# Altium schematic symbol library BARKO_SCHLIB.SchLib: 1064 symbols (part 9 of 11) (continued)
## R-2R49-2512 (continued)

## R-3K3-0402
designator R?, comment 3K3  Tolerance: 1%  Case Code (Imperial): 0402
RES SMD 3.3K OHM 1% 1/10W 0402; Manufacturer: Panasonic; Manufacturer Part Number: ERJ-2RKF3301X; Resistance: 3.3kR; Temperature Coefficient: 100ppm/°C; Power Rating: 100mW; Voltage Rating: 50V; .PCBCHK: USED; .Creator: F:TALI; Washability: OK; Stock 1: 1719958; Pricing 1: 1=0.1, 10=0.045, 100=0.0183, 1000=0.00823, 2500=0.00715, 5000=0.0059 (USD); Mount: Surface Mount; Case/Package: 0402; Number of Pins: 2; Contact Plating: Tin; Case Code (Metric): 1005; Min Operating Temperature: -55°C; Max Operating Temperature: 155°C; Composition: Thick Film; Packaging: Tape and Reel; Package Quantity: 1; Number of Terminations: 2; Termination: SMD/SMT; Military Standard: Not; Max Power Dissipation: 100mW; Voltage Rating (DC): 50V; Features: Automotive AEC-Q200; Length: 1mm; Height: 0.35mm; Width: 0.02inch; Depth: 0.5mm; Radiation Hardening: No; REACH SVHC: No SVHC; Lead Free: Lead Free; ComponentLink1URL: http://www.farnell.com/datasheets/1678782.pdf; ComponentLink1Description: http://www.farnell.com/datasheets/1678782.pdf; ComponentLink2URL: http://industrial.panasonic.com/www-data/pdf/AOA0000/AOA0000CE2.pdf; ComponentLink2Description: http://industrial.panasonic.com/www-data/pdf/AOA0000/AOA0000CE2.pdf; ComponentLink3URL: http://www.alliedelec.com/m/d/623f45ff1957d936ff56d46fd1c28cac.pdf; ComponentLink3Description: http://www.alliedelec.com/m/d/623f45ff1957d936ff56d46fd1c28cac.pdf; ComponentLink4URL: http://www.farnell.com/datasheets/1911175.pdf; ComponentLink4Description: http://www.farnell.com/datasheets/1911175.pdf; Stock 2: 19896; Pricing 2: 1=0.1, 10=0.076, 100=0.029, 1000=0.01278, 2500=0.01104, 5000=0.00987 (USD); Thickness: 356um; ComponentLink5URL: http://www.bourns.com/pdfs/CR0402.pdf; ComponentLink5Description: http://www.bourns.com/pdfs/CR0402.pdf; ComponentLink6URL: https://www.verical.com/server-webapp/html/getDatasheet?partID=33138; ComponentLink6Description: https://www.verical.com/server-webapp/html/getDatasheet?partID=33138; Stock 3: 49804; Pricing 3: 1=0.1, 10=0.016, 100=0.0064, 1000=0.00289, 2500=0.0025, 5000=0.00207 (USD); .SCHCHK: USED; Supplier 1: Digi-Key; Supplier Part Number 1: RMCF0402FT3K30DKR-ND
footprint R-0402
pins: 1, 2

## R-3K3-0603
designator R?, comment 3K3  Tolerance: 1%  Case Code (Imperial): 0603
RES SMD 3.3K OHM 1% 1/10W 0603; Manufacturer: Yageo; Manufacturer Part Number: RC0603JR-073K3L; Resistance: 3.3kR; Power Rating: 100mW; Voltage Rating: 50V; Temperature Coefficient: 100ppm/°C; .PCBCHK: USED; .Creator: F:TALI; Washability: OK; Case/Package: 0603; Number of Pins: 2; Case Code (Metric): 1608; Min Operating Temperature: -55°C; Max Operating Temperature: 155°C; Voltage Rating (DC): 50V; Packaging: Tape and Reel; Termination: SMD/SMT; Composition: Thick Film; Military Standard: Not; Length: 1.6mm; Width: 0.8mm; Depth: 0.8mm; REACH SVHC: No SVHC; Lead Free: Lead Free; ComponentLink1URL: http://www.farnell.com/datasheets/443971.pdf; ComponentLink1Description: http://www.farnell.com/datasheets/443971.pdf; Stock 1: 1678788; Pricing 1: 1=0.1, 10=0.065, 100=0.0264, 1000=0.01186, 2500=0.01029 (USD); Mount: Surface Mount; Contact Plating: Tin; Package Quantity: 1; Number of Terminations: 2; Max Power Dissipation: 100mW; Features: Automotive AEC-Q200; Height: 0.022inch; Radiation Hardening: No; ComponentLink2URL: http://www.alliedelec.com/m/d/623f45ff1957d936ff56d46fd1c28cac.pdf; ComponentLink2Description: http://www.alliedelec.com/m/d/623f45ff1957d936ff56d46fd1c28cac.pdf; ComponentLink3URL: http://www.farnell.com/datasheets/1678782.pdf; ComponentLink3Description: http://www.farnell.com/datasheets/1678782.pdf; ComponentLink4URL: http://industrial.panasonic.com/www-data/pdf/AOA0000/AOA0000CE2.pdf; ComponentLink4Description: http://industrial.panasonic.com/www-data/pdf/AOA0000/AOA0000CE2.pdf; ComponentLink5URL: http://www.farnell.com/datasheets/426256.pdf; ComponentLink5Description: http://www.farnell.com/datasheets/426256.pdf; .SCHCHK: USED; Stock 2: 97674; Pricing 2: 1=0.10000, 10=0.01700, 100=0.00680, 1000=0.00306, 2500=0.00266 (USD); RoHS: Yes; ComponentLink6URL: https://datasheet.ciiva.com/15193/getdatasheetpartid-376121-15193477.pdf?src-supplier=Verical; ComponentLink6Description: https://datasheet.ciiva.com/15193/getdatasheetpartid-376121-15193477.pdf?src-supplier=Verical; Stock 3: 171378; Pricing 3: 1=0.10000, 10=0.02300, 100=0.00950, 1000=0.00429, 2500=0.00372 (USD); ComponentLink7URL: https://datasheet.ciiva.com/5554/rk73h-5554599.pdf?src-supplier=Mouser; ComponentLink7Description: https://datasheet.ciiva.com/5554/rk73h-5554599.pdf?src-supplier=Mouser; ComponentLink8URL: https://datasheet.ciiva.com/48426/rk73h-series-eng-jap-tds-48426588.pdf?src-supplier=Distrelec; ComponentLink8Description: https://datasheet.ciiva.com/48426/rk73h-series-eng-jap-tds-48426588.pdf?src-supplier=Distrelec; Supplier 1: Digi-Key; Supplier Part Number 1: RMCF0603FT3K30CT-ND
footprint R-0603
pins: 1, 2

## R-3K3-0804
designator R?, comment 3K3
RES ARRAY 4 RES 3.3K OHM 0804; Manufacturer: Panasonic; Manufacturer Part Number: EXB-28V332JX; Number of Terminals/Pins: 8; Resistance: 3.3kR; Tolerance: 5%; Voltage Rating: 50V; Number of Elements: 4; Voltage Rating (DC): 100V; Circuit Type: Isolated; Power Per Element: 62.5mW; Temperature Coefficient: 200ppm/°C; Supplier 1: Digi-Key; RoHS: Yes; Category: Resistor Arrays; Stock 1: 11021; Pricing 1: 1=0.10000, 10=0.07200, 25=0.04960, 50=0.03860, 100=0.02750, 250=0.02144, 500=0.01706, 1000=0.01210, 5000=0.00935 (USD); Mount: Surface Mount; Case/Package: 0804; Number of Pins: 8; Contact Plating: Tin; Case Code (Metric): 1005; Case Code (Imperial): 0402; Min Operating Temperature: -55°C; Max Operating Temperature: 125°C; Packaging: Tape and Reel; Package Quantity: 1; Number of Contacts: 8; Number of Resistors: 4; Termination: Convex; Length: 2mm; Width: 0.039inch; Height: 0.018inch; Terminal Pitch: 0.5mm; Radiation Hardening: No; REACH SVHC: No SVHC; ComponentLink1URL: https://datasheet.ciiva.com/5735/1480003-5735116.pdf?src-supplier=Farnell; ComponentLink1Description: https://datasheet.ciiva.com/5735/1480003-5735116.pdf?src-supplier=Farnell; ComponentLink2URL: https://datasheet.ciiva.com/30180/aoc0000ce1-30180253.pdf?src-supplier=Onlinecomponents.com; ComponentLink2Description: https://datasheet.ciiva.com/30180/aoc0000ce1-30180253.pdf?src-supplier=Onlinecomponents.com; ComponentLink3URL: https://datasheet.ciiva.com/46400/1480003-46400588.pdf?src-supplier=Element14; ComponentLink3Description: https://datasheet.ciiva.com/46400/1480003-46400588.pdf?src-supplier=Element14; Supplier Part Number 1: Y7332CT-ND
footprint R-0804 (SMD, 8-Leads, Body 2x1mm, Pitch 0.5mm)
pins: 1, 2, 3, 4, 5, 6, 7, 8

## R-3K3-0805
designator R?, comment 3K3  Case Code (Imperial): 0805
RES SMD 3.3K OHM 1/8W 5% 0805; Manufacturer: Stackpole Electronics; Manufacturer Part Number: RMCF0805JT3K30; Resistance: 3.3kR; Power Rating: 125mW; Temperature Coefficient: 200ppm/°C; Voltage Rating (DC): 150V; .PCBCHK: USED; .Creator: F:TALI; Washability: OK; Stock 1: 73817; Pricing 1: 1=0.1, 10=0.021, 100=0.0086, 1000=0.00385, 2500=0.00334 (USD); Mount: Surface Mount; Case/Package: 0805; Case Code (Metric): 2012; Contact Plating: Matte,Tin; Min Operating Temperature: -55°C; Max Operating Temperature: 155°C; Packaging: Tape and Reel; Tolerance: 5%; Composition: Thick Film; Number of Terminations: 2; Military Standard: Not; Max Power Dissipation: 125mW; Features: Automotive AEC-Q200; Length: 2mm; Height: 0.026inch; Width: 0.049inch; Depth: 1.25mm; Radiation Hardening: No; Lead Free: Lead Free; ComponentLink1URL: https://www.verical.com/server-webapp/html/getDatasheet?partID=360140; ComponentLink1Description: https://www.verical.com/server-webapp/html/getDatasheet?partID=360140; Stock 2: 12604; Pricing 2: 1=0.1, 10=0.059, 100=0.024, 1000=0.01079, 2500=0.00936 (USD); ComponentLink2URL: http://www.samsungsem.com/kr/support/library/product-catalog/__icsFiles/afieldfile/2015/09/22/CHIP_RESISTOR_2015.pdf; ComponentLink2Description: http://www.samsungsem.com/kr/support/library/product-catalog/__icsFiles/afieldfile/2015/09/22/CHIP_RESISTOR_2015.pdf; Stock 3: 6239; Pricing 3: 1=0.1, 10=0.049, 100=0.02, 1000=0.00898, 2500=0.00779 (USD); Package Quantity: 5000; ComponentLink3URL: http://www.te.com/commerce/DocumentDelivery/DDEController?Action=srchrtrv&DocNm=1773204&DocType=DS&DocLang=English; ComponentLink3Description: http://www.te.com/commerce/DocumentDelivery/DDEController?Action=srchrtrv&DocNm=1773204&DocType=DS&DocLang=English; ComponentLink4URL: http://www.onlinecomponents.com/productFiles/mf-AMP/eng_ds_1773204_e.pdf; ComponentLink4Description: http://www.onlinecomponents.com/productFiles/mf-AMP/eng_ds_1773204_e.pdf; ComponentLink5URL: http://www.te.com/commerce/DocumentDelivery/DDEController?Action=showdoc&DocId=Data+Sheet%7F1773204%7FF%7Fpdf%7FEnglish%7FENG_DS_1773204_F.pdf; ComponentLink5Description: http://www.te.com/commerce/DocumentDelivery/DDEController?Action=showdoc&DocId=Data+Sheet%7F1773204%7FF%7Fpdf%7FEnglish%7FENG_DS_1773204_F.pdf; .SCHCHK: USED; Supplier 1: Digi-Key; Supplier Part Number 1: RMCF0805JT3K30DKR-ND
footprint R-0805
pins: 1, 2

## R-3K3-1206 Array
designator R?, comment 3K3
RES ARRAY 4 RES 3.3K OHM 1206; Manufacturer: Stackpole Electronics; Manufacturer Part Number: RAVF164DJT3K30; Number of Terminals/Pins: 8; Temperature Coefficient: 200ppm/°C; Resistance: 3.3kR; Tolerance: 5%; Circuit Type: Isolated; Number of Resistors: 4; Power Per Element: 62.5mW; Supplier 1: Digi-Key; RoHS: Yes; Category: Resistor Arrays; Stock 1: 569; Pricing 1: 1=0.10000, 10=0.04400, 25=0.03160, 50=0.02400, 100=0.01770, 250=0.01352, 500=0.01080, 1000=0.00795 (USD); Mount: Surface Mount; Case/Package: SMD/SMT; Number of Pins: 8; Case Code (Metric): 3216; Case Code (Imperial): 1206; Min Operating Temperature: -55°C; Max Operating Temperature: 155°C; Package Quantity: 1; Packaging: Tape and Reel; Termination: Convex; Length: 0.126inch; Width: 0.063inch; Height: 0.024inch; Depth: 1.6mm; Terminal Pitch: 0.8mm; Radiation Hardening: No; Military Standard: Not; ComponentLink1URL: https://www.verical.com/server-webapp/html/getDatasheet?partID=365383&src-supplier=Verical; ComponentLink1Description: https://www.verical.com/server-webapp/html/getDatasheet?partID=365383&src-supplier=Verical; ComponentLink2URL: https://www.seielect.com/catalog/SEI-Packaging.pdf?src-supplier=Digi-Key; ComponentLink2Description: https://www.seielect.com/catalog/SEI-Packaging.pdf?src-supplier=Digi-Key; ComponentLink3URL: https://www.seielect.com/Catalog/SEI-RAVF.pdf?src-supplier=Digi-Key; ComponentLink3Description: https://www.seielect.com/Catalog/SEI-RAVF.pdf?src-supplier=Digi-Key; ComponentLink4URL: https://www.seielect.com/Catalog/SEI-RAVF.pdf?src-supplier=Avnet; ComponentLink4Description: https://www.seielect.com/Catalog/SEI-RAVF.pdf?src-supplier=Avnet; Supplier Part Number 1: RAVF164DJT3K30CT-ND
footprint R-1206-ARRAY (SMD, 8-Leads, Body 1.6x3.2mm, Pitch 0.8mm)
pins: 1, 2, 3, 4, 5, 6, 7, 8

## R-3K6-0603
designator R?, comment 3K6  Case Code (Imperial): 0603
RES SMD 3.6K OHM 5% 1/10W 0603; Manufacturer: Yageo; Manufacturer Part Number: RC0603JR-073K6L; Resistance: 3.6kR; Temperature Coefficient: 100ppm/°C; Power Rating: 100mW; Voltage Rating: 75V; Voltage Rating (DC): 50V; .PCBCHK: USED; .Creator: F:TALI; Washability: OK; Stock 1: 445800; Pricing 1: 1=0.1, 10=0.022, 100=0.0088, 1000=0.00396, 2500=0.00344 (USD); Case/Package: 0603; Weight: 7.1E-05oz; Contact Plating: Matte,Tin; Case Code (Metric): 1608; Min Operating Temperature: -55°C; Max Operating Temperature: 155°C; Tolerance: 5%; Composition: Thick Film; Packaging: Tape and Reel; Termination: SMD/SMT; Military Standard: Not; Length: 1.6mm; Height: 0.45mm; Width: 0.8mm; Depth: 0.8mm; Lead Free: Lead Free; ComponentLink1URL: http://www.yageo.com/documents/recent/PYu-RC0603_51_RoHS_L_4.pdf; ComponentLink1Description: http://www.yageo.com/documents/recent/PYu-RC0603_51_RoHS_L_4.pdf; Mount: Surface Mount; Number of Terminations: 2; Max Power Dissipation: 100mW; Features: Automotive AEC-Q200; Package Quantity: 1; Working Voltage: 75V; Radiation Hardening: No; REACH SVHC: Unknown; ComponentLink2URL: http://uk.rs-online.com/webdocs/0d98/0900766b80d98afc.pdf; ComponentLink2Description: http://uk.rs-online.com/webdocs/0d98/0900766b80d98afc.pdf; ComponentLink3URL: http://www.vishay.com/docs/20035/dcrcwe3.pdf; ComponentLink3Description: http://www.vishay.com/docs/20035/dcrcwe3.pdf; ComponentLink4URL: https://www.alliedelec.com/m/d/0c934d6939ccefa68dbe0b96d821c8cf.pdf; ComponentLink4Description: https://www.alliedelec.com/m/d/0c934d6939ccefa68dbe0b96d821c8cf.pdf; ComponentLink5URL: http://www.mouser.com/ds/2/427/dcrcwe3-109170.pdf; ComponentLink5Description: http://www.mouser.com/ds/2/427/dcrcwe3-109170.pdf; Stock 2: 480818; Pricing 2: 1=0.1, 10=0.043, 100=0.0176, 1000=0.00791, 2500=0.00686 (USD); ComponentLink6URL: http://www.farnell.com/datasheets/2059623.pdf; ComponentLink6Description: http://www.farnell.com/datasheets/2059623.pdf; ComponentLink7URL: http://industrial.panasonic.com/www-data/pdf/AOA0000/AOA0000CE1.pdf; ComponentLink7Description: http://industrial.panasonic.com/www-data/pdf/AOA0000/AOA0000CE1.pdf; ComponentLink8URL: https://www.alliedelec.com/m/d/51cd0790071e1666bdb9d00c57fcf960.pdf; ComponentLink8Description: https://www.alliedelec.com/m/d/51cd0790071e1666bdb9d00c57fcf960.pdf; Stock 3: 334768; Pricing 3: 1=0.1, 10=0.065, 100=0.0264, 1000=0.01186, 2500=0.01029 (USD); ComponentLink9URL: http://industrial.panasonic.com/cdbs/www-data/pdf/RDA0000/AOA0000COL19.pdf; ComponentLink9Description: http://industrial.panasonic.com/cdbs/www-data/pdf/RDA0000/AOA0000COL19.pdf; ComponentLink10URL: https://www.alliedelec.com/m/d/623f45ff1957d936ff56d46fd1c28cac.pdf; ComponentLink10Description: https://www.alliedelec.com/m/d/623f45ff1957d936ff56d46fd1c28cac.pdf; ComponentLink11URL: http://industrial.panasonic.com/www-data/pdf/AOA0000/AOA0000CE2.pdf; ComponentLink11Description: http://industrial.panasonic.com/www-data/pdf/AOA0000/AOA0000CE2.pdf; ComponentLink12URL: http://www.farnell.com/datasheets/1678782.pdf; ComponentLink12Description: http://www.farnell.com/datasheets/1678782.pdf; ComponentLink13URL: http://www.alliedelec.com/m/d/623f45ff1957d936ff56d46fd1c28cac.pdf; ComponentLink13Description: http://www.alliedelec.com/m/d/623f45ff1957d936ff56d46fd1c28cac.pdf; ComponentLink14URL: http://components.arrow.com/part/dataview/3984664S9736721N1386; ComponentLink14Description: http://components.arrow.com/part/dataview/3984664S9736721N1386; .SCHCHK: USED; Supplier 1: Digi-Key; Supplier Part Number 1: 311-3.6KGRDKR-ND
footprint R-0603
pins: 1, 2

## R-3K6-0805
designator R?, comment 3K6  Case Code (Imperial): 0805
RES SMD 3.6K OHM 5% 1/8W 0805; Manufacturer: Yageo; Manufacturer Part Number: RC0805JR-073K6L; Resistance: 3.6kR; Temperature Coefficient: 100ppm/°C; Power Rating: 125mW; Voltage Rating: 150V; .PCBCHK: USED; .Creator: F:TALI; Washability: OK; Stock 1: 31900; Pricing 1: 100=0.03482, 1000=0.01429, 5000=0.00635, 15000=0.00531, 50000=0.00449 (USD); Case/Package: 0805; Contact Plating: Matte,Tin; Case Code (Metric): 2012; Min Operating Temperature: -55°C; Max Operating Temperature: 155°C; Tolerance: 5%; Composition: Thick Film; Packaging: Tape and Reel; Termination: SMD/SMT; Military Standard: Not; Voltage Rating (DC): 150V; Length: 2mm; Height: 0.5mm; Width: 1.25mm; Depth: 1.25mm; Radiation Hardening: No; Lead Free: Lead Free; ComponentLink1URL: http://www.mouser.com/ds/2/447/Yageo_08112016_RC0805-968729.pdf; ComponentLink1Description: http://www.mouser.com/ds/2/447/Yageo_08112016_RC0805-968729.pdf; ComponentLink2URL: http://www.yageo.ru/pdf/RC0805.pdf; ComponentLink2Description: http://www.yageo.ru/pdf/RC0805.pdf; Stock 2: 7308; Pricing 2: 1=0.1, 10=0.028, 100=0.0114, 1000=0.00513, 2500=0.00445 (USD); Mount: Surface Mount; Number of Terminations: 2; Max Power Dissipation: 125mW; Features: Automotive AEC-Q200; Stock 3: 68500; Pricing 3: 1=0.1, 10=0.081, 100=0.0311, 1000=0.01367, 2500=0.01181 (USD); Weight: 0.000194oz; Package Quantity: 1; REACH SVHC: No SVHC; ComponentLink3URL: http://www.farnell.com/datasheets/1678782.pdf; ComponentLink3Description: http://www.farnell.com/datasheets/1678782.pdf; ComponentLink4URL: http://www.mouser.com/ds/2/315/AOA0000C283-1093288.pdf; ComponentLink4Description: http://www.mouser.com/ds/2/315/AOA0000C283-1093288.pdf; .SCHCHK: USED; Supplier 1: TME; Supplier Part Number 1: RC0805JR-073K6
footprint R-0805
pins: 1, 2

## R-3mR-1206
designator R?, comment Resistance: 3mR  Power Rating: 1W  Case Code (Imperial): 1206  (hidden comment: CSNL1206FT3L00)
RES 0.003 OHM 1% 1W 1206; Manufacturer: Stackpole Electronics; Temperature Coefficient: 50ppm/°C; Washability: OK; .Creator: M.OZKAN; .PCBCHK: USED; Supplier 1: Arrow; Manufacturer Part Number: CSNL1206FT3L00; Stock 1: 4000; Pricing 1: 1=0,59390, 10=0,50440, 25=0,43770, 100=0,34920, 250=0,31240, 500=0,25490, 1000=0,20690, 3000=0,20490 (USD); RoHS: Yes; Mount: Surface Mount; Case/Package: 1206; Case Code (Metric): 3216; Contact Plating: Tin,Matte; Min Operating Temperature: -55°C; Max Operating Temperature: 170°C; Tolerance: 1%; Packaging: Tape and Reel; Composition: Metal Foil; Number of Terminations: 2; Military Standard: Not; Max Power Dissipation: 1W; Features: Moisture Resistant; Length: 0.126inch; Height: 0.035inch; Width: 0.063inch; Depth: 1.6mm; Radiation Hardening: No; Lead Free: Lead Free; ComponentLink1URL: http://components.arrow.com/part/dataview/55793397S789987N1174?src-supplier=Arrow; ComponentLink1Description: http://components.arrow.com/part/dataview/55793397S789987N1174?src-supplier=Arrow; ComponentLink2URL: https://www.seielect.com/catalog/SEI-Packaging.pdf?src-supplier=Digi-Key; ComponentLink2Description: https://www.seielect.com/catalog/SEI-Packaging.pdf?src-supplier=Digi-Key; ComponentLink3URL: https://www.seielect.com/Catalog/SEI-CSNL.pdf?src-supplier=Avnet; ComponentLink3Description: https://www.seielect.com/Catalog/SEI-CSNL.pdf?src-supplier=Avnet; Supplier Part Number 1: CSNL1206FT3L00; .SCHCHK: USED
footprint R-1206
pins: 1, 2

## R-3R3-0603
designator R?, comment 3R3
RES 3.3 OHM 5% 1/10W 0603; Manufacturer: Stackpole Electronics; Manufacturer Part Number: RMCF0603JT3R30; .PCBCHK: USED; .Creator: F:TALI; Washability: OK; Max Power Dissipation: 100mW; Temperature Coefficient: 200ppm/°C; Resistance: 3.3R; ComponentLink1URL: http://industrial.panasonic.com/www-data/pdf/AOA0000/AOA0000CE1.pdf; ComponentLink1Description: http://industrial.panasonic.com/www-data/pdf/AOA0000/AOA0000CE1.pdf; ComponentLink2URL: http://www.farnell.com/datasheets/1678796.pdf; ComponentLink2Description: http://www.farnell.com/datasheets/1678796.pdf; ComponentLink3URL: http://www.alliedelec.com/m/d/51cd0790071e1666bdb9d00c57fcf960.pdf; ComponentLink3Description: http://www.alliedelec.com/m/d/51cd0790071e1666bdb9d00c57fcf960.pdf; ComponentLink4URL: http://www.farnell.com/datasheets/1500035.pdf; ComponentLink4Description: http://www.farnell.com/datasheets/1500035.pdf; ComponentLink5URL: http://www.farnell.com/datasheets/2059623.pdf; ComponentLink5Description: http://www.farnell.com/datasheets/2059623.pdf; ComponentLink6URL: http://www.produktinfo.conrad.com/datenblaetter/450000-474999/454650-da-01-en-WIDERSTAND_0603.pdf; ComponentLink6Description: http://www.produktinfo.conrad.com/datenblaetter/450000-474999/454650-da-01-en-WIDERSTAND_0603.pdf; ComponentLink7URL: http://www.produktinfo.conrad.com/datenblaetter/425000-449999/436677-da-01-en-SMD_WIDERSTAND_0603_RC_1608_3R30_1__0_1W.pdf; ComponentLink7Description: http://www.produktinfo.conrad.com/datenblaetter/425000-449999/436677-da-01-en-SMD_WIDERSTAND_0603_RC_1608_3R30_1__0_1W.pdf; ComponentLink8URL: http://www.yageo.com/documents/recent/PYu-RC_Group_51_RoHS_L_9.pdf; ComponentLink8Description: http://www.yageo.com/documents/recent/PYu-RC_Group_51_RoHS_L_9.pdf; ComponentLink9URL: http://www.farnell.com/datasheets/443971.pdf; ComponentLink9Description: http://www.farnell.com/datasheets/443971.pdf; ComponentLink10URL: http://www.farnell.com/datasheets/1686128.pdf; ComponentLink10Description: http://www.farnell.com/datasheets/1686128.pdf; ComponentLink11URL: http://www.farnell.com/datasheets/1868787.pdf; ComponentLink11Description: http://www.farnell.com/datasheets/1868787.pdf; ComponentLink12URL: http://www.alliedelec.com/m/d/623f45ff1957d936ff56d46fd1c28cac.pdf; ComponentLink12Description: http://www.alliedelec.com/m/d/623f45ff1957d936ff56d46fd1c28cac.pdf; ComponentLink13URL: http://www.farnell.com/datasheets/1678782.pdf; ComponentLink13Description: http://www.farnell.com/datasheets/1678782.pdf; ComponentLink14URL: http://industrial.panasonic.com/www-data/pdf/AOA0000/AOA0000CE2.pdf; ComponentLink14Description: http://industrial.panasonic.com/www-data/pdf/AOA0000/AOA0000CE2.pdf; ComponentLink15URL: http://www.farnell.com/datasheets/426256.pdf; ComponentLink15Description: http://www.farnell.com/datasheets/426256.pdf; .SCHCHK: USED; Supplier 1: Digi-Key; Supplier Part Number 1: RMCF0603JT3R30CT-ND; Stock: 8486; Pricing: 1=0.1, 10=0.019, 100=0.0077, 1000=0.0035, 2500=0.003 (USD); RoHS: Yes; Mount: Surface Mount; Case/Package: 0603; Case Code (Imperial): 0603; Contact Plating: Tin,Matte; Case Code (Metric): 1608; Min Operating Temperature: -55°C; Max Operating Temperature: 155°C; Features: Automotive AEC-Q200; Resistor Type: Thick Film; Number of Terminations: 2; Tolerance: 5%; Packaging: Tape and Reel; Power Rating: 100mW; Length: 0.061inch; Height: 0.022inch; Width: 0.031inch; Radiation Hardening: No; Lead Free: Lead Free; ComponentLink16URL: http://components.arrow.com/part/dataview/50501732S7597585N1174?src-supplier=Arrow+Electronics; ComponentLink16Description: http://components.arrow.com/part/dataview/50501732S7597585N1174?src-supplier=Arrow+Electronics; ComponentLink17URL: https://www.seielect.com/Catalog/SEI-RMCF_RMCP.pdf?src-supplier=Digi-Key; ComponentLink17Description: https://www.seielect.com/Catalog/SEI-RMCF_RMCP.pdf?src-supplier=Digi-Key; ComponentLink18URL: https://www.seielect.com/catalog/SEI-Packaging.pdf?src-supplier=Digi-Key; ComponentLink18Description: https://www.seielect.com/catalog/SEI-Packaging.pdf?src-supplier=Digi-Key; ComponentLink19URL: http://www.seielect.com/catalog/sei-rmc.pdf?src-supplier=Future+Electronics; ComponentLink19Description: http://www.seielect.com/catalog/sei-rmc.pdf?src-supplier=Future+Electronics; ComponentLink20URL: https://www.seielect.com/catalog/SEI-RMCF_RMCP.pdf?src-supplier=Avnet; ComponentLink20Description: https://www.seielect.com/catalog/SEI-RMCF_RMCP.pdf?src-supplier=Avnet
footprint R-0603
pins: 1, 2

## R-4K7-0603
designator R?, comment 4K7  Case Code (Imperial): 0603
RES SMD 4.7K OHM 1% 1/10W 0603; Manufacturer: Yageo; Manufacturer Part Number: RC0603FR-074K7P; Resistance: 4.7kR; Max Power Dissipation: 100mW; Temperature Coefficient: 150ppm/°C; Voltage Rating (DC): 50V; .PCBCHK: USED; .Creator: F:TALI; Washability: OK; Stock 1: 0; Pricing 1: 1=0.1, 10=0.044, 100=0.0178, 1000=0.00798, 2500=0.00693 (USD); Case/Package: 0603; Case Code (Metric): 1608; Min Operating Temperature: -55°C; Max Operating Temperature: 155°C; Packaging: Tape and Reel; Composition: Thick Film; Number of Terminations: 2; Tolerance: 1%; Features: Moisture Resistant; Length: 0.063inch; Height: 0.022inch; Width: 0.031inch; Stock 2: 22560342; Pricing 2: 1=0.1, 10=0.026, 100=0.0111, 1000=0.00517, 2500=0.00454 (USD); Number of Pins: 2; Power Rating: 100mW; Voltage Rating: 50V; Termination: SMD/SMT; Military Standard: Not; Depth: 0.8mm; Lead Pitch: 0.3mm; REACH SVHC: No SVHC; Lead Free: Lead Free; ComponentLink1URL: https://www.verical.com/server-webapp/html/getDatasheet?partID=422754; ComponentLink1Description: https://www.verical.com/server-webapp/html/getDatasheet?partID=422754; ComponentLink2URL: http://documents.rs-components.com/techlib://itc_doclist_GB.htm?stockno=5047357; ComponentLink2Description: http://documents.rs-components.com/techlib://itc_doclist_GB.htm?stockno=5047357; ComponentLink3URL: http://www.farnell.com/datasheets/443971.pdf; ComponentLink3Description: http://www.farnell.com/datasheets/443971.pdf; ComponentLink4URL: http://www.farnell.com/datasheets/38590.pdf; ComponentLink4Description: http://www.farnell.com/datasheets/38590.pdf; ComponentLink5URL: http://www.farnell.com/datasheets/1868787.pdf; ComponentLink5Description: http://www.farnell.com/datasheets/1868787.pdf; Stock 3: 0; Pricing 3: 100=0.0172, 1000=0.0073, 5000=0.00301, 15000=0.00258, 50000=0.00215 (USD); .SCHCHK: USED; Supplier 1: Digi-Key; Supplier Part Number 1: YAG1304DKR-ND
footprint R-0603
pins: 1, 2

## R-4K7-0805
designator R?, comment 4K7  Case Code (Imperial): 0805
RES SMD 4.7K OHM 1/8W 1% 0805; Manufacturer: Yageo; Manufacturer Part Number: RC0805FR-074K7L; Resistance: 4.7kR; Temperature Coefficient: 100ppm/°C; Voltage Rating (DC): 150V; Power Rating: 125mW; .PCBCHK: USED; .Creator: F:TALI; Washability: OK; Stock 1: 7550000; Pricing 1: 5000=0.00544, 10000=0.00473, 25000=0.00415, 50000=0.00381, 125000=0.00373 (USD); Case/Package: 0805; Number of Pins: 2; Case Code (Metric): 2012; Min Operating Temperature: -55°C; Max Operating Temperature: 155°C; Tolerance: 1%; Composition: Thick Film; Packaging: Tape and Reel; Package Quantity: 5000; Voltage Rating: 150V; Number of Terminations: 2; Termination: SMD/SMT; Military Standard: Not; Max Power Dissipation: 125mW; Features: Moisture Resistant; Length: 0.079inch; Height: 0.024inch; Width: 0.049inch; Depth: 1.25mm; REACH SVHC: No SVHC; Lead Free: Lead Free; ComponentLink1URL: http://www.farnell.com/datasheets/444164.pdf; ComponentLink1Description: http://www.farnell.com/datasheets/444164.pdf; ComponentLink2URL: http://www.farnell.com/datasheets/1686128.pdf; ComponentLink2Description: http://www.farnell.com/datasheets/1686128.pdf; ComponentLink3URL: http://www.yageo.com/documents/recent/PYu-RC_Group_51_RoHS_L_9.pdf; ComponentLink3Description: http://www.yageo.com/documents/recent/PYu-RC_Group_51_RoHS_L_9.pdf; Stock 2: 1549165; Pricing 2: 1=0.1, 10=0.039, 100=0.0159, 1000=0.00716, 2500=0.00622 (USD); Contact Plating: Lead,Matte,Tin; Radiation Hardening: No; ComponentLink4URL: http://www.farnell.com/datasheets/442941.pdf; ComponentLink4Description: http://www.farnell.com/datasheets/442941.pdf; ComponentLink5URL: http://www.yageo.ru/pdf/RC0805.pdf; ComponentLink5Description: http://www.yageo.ru/pdf/RC0805.pdf; ComponentLink6URL: http://www.mouser.com/ds/2/447/Yageo_08112016_RC0805-968729.pdf; ComponentLink6Description: http://www.mouser.com/ds/2/447/Yageo_08112016_RC0805-968729.pdf; Stock 3: 874762; Pricing 3: 1=0.1, 10=0.021, 100=0.0086, 1000=0.00385, 2500=0.00334 (USD); Mount: Surface Mount; .SCHCHK: USED; Supplier 1: Digi-Key; Supplier Part Number 1: 311-4.70KCRTR-ND
footprint R-0805
pins: 1, 2

## R-4K7-1206
designator R?, comment 4K7  Case Code (Imperial): 1206
RES SMD 4.7K OHM 1% 1/4W 1206; Manufacturer: Yageo; Manufacturer Part Number: RC1206FR-074K7L; Resistance: 4.7kR; Temperature Coefficient: 100ppm/°C; Voltage Rating (DC): 200V; Power Rating: 250mW; .PCBCHK: USED; .Creator: F:TALI; Washability: OK; Stock 1: 3078553; Pricing 1: 1=0.1, 10=0.081, 100=0.0331, 1000=0.01487, 2500=0.01291 (USD); Case/Package: 1206; Number of Pins: 2; Case Code (Metric): 3216; Min Operating Temperature: -55°C; Max Operating Temperature: 155°C; Tolerance: 1%; Packaging: Tape and Reel; Composition: Thick Film; Voltage Rating: 200V; Package Quantity: 1; Termination: SMD/SMT; Number of Terminations: 2; Military Standard: Not; Max Power Dissipation: 250mW; Features: Moisture Resistant; Height: 0.026inch; Width: 0.063inch; REACH SVHC: Unknown; ComponentLink1URL: http://www.farnell.com/datasheets/1692832.pdf; ComponentLink1Description: http://www.farnell.com/datasheets/1692832.pdf; ComponentLink2URL: http://www.yageo.com/documents/recent/PYu-RC1206_51_RoHS_L-4.pdf; ComponentLink2Description: http://www.yageo.com/documents/recent/PYu-RC1206_51_RoHS_L-4.pdf; ComponentLink3URL: http://www.yageo.com/documents/recent/PYu-RC_Group_51_RoHS_L_9.pdf; ComponentLink3Description: http://www.yageo.com/documents/recent/PYu-RC_Group_51_RoHS_L_9.pdf; ComponentLink4URL: http://documents.rs-components.com/techlib://itc_doclist_GB.htm?stockno=6178884; ComponentLink4Description: http://documents.rs-components.com/techlib://itc_doclist_GB.htm?stockno=6178884; ComponentLink5URL: http://www.yageo.com.tw/exep/pages/download/literatures/PYu-R_INT-thick_7.pdf; ComponentLink5Description: http://www.yageo.com.tw/exep/pages/download/literatures/PYu-R_INT-thick_7.pdf; Stock 2: 2562361; Pricing 2: 1=0.1, 10=0.07, 100=0.0284, 1000=0.01274, 2500=0.01106 (USD); ComponentLink6URL: http://www.farnell.com/datasheets/444357.pdf; ComponentLink6Description: http://www.farnell.com/datasheets/444357.pdf; ComponentLink7URL: https://produktinfo.conrad.com/datenblaetter/400000-424999/402621-da-01-en-SMD_Widerstand_Chip1206_4_7_kOhm.pdf; ComponentLink7Description: https://produktinfo.conrad.com/datenblaetter/400000-424999/402621-da-01-en-SMD_Widerstand_Chip1206_4_7_kOhm.pdf; Stock 3: 139659; Pricing 3: 1=0.1, 10=0.03, 100=0.0121, 1000=0.00545, 2500=0.00473 (USD); Mount: Surface Mount; Contact Plating: Matte,Tin; Radiation Hardening: No; ComponentLink8URL: https://www.verical.com/server-webapp/html/getDatasheet?partID=360146; ComponentLink8Description: https://www.verical.com/server-webapp/html/getDatasheet?partID=360146; Depth: 1.6mm; Lead Free: Lead Free; Length: 3.1mm; .SCHCHK: USED; Supplier 1: Digi-Key; Supplier Part Number 1: 311-4.70KFRCT-ND
footprint R-1206
pins: 1, 2

## R-4K7-1210
designator R?, comment 4K7  Max Power Dissipation: 1/3W  Case Code (Imperial): 1210
RES SMD 4.7K OHM 1% 1/3W 1210; Manufacturer: Rohm; Manufacturer Part Number: KTR25JZPF4701; Resistance: 4.7kR; Temperature Coefficient: 100ppm/°C; .PCBCHK: USED; .Creator: F:TALI; Washability: OK; Stock 1: 5063; Pricing 1: 1=0.46, 10=0.334, 100=0.1336, 1000=0.06582 (USD); Case/Package: 1210; Case Code (Metric): 3225; Min Operating Temperature: -55°C; Max Operating Temperature: 155°C; Package Quantity: 4000; Packaging: Cut Tape; Tolerance: 1%; Composition: Thick Film; Number of Terminations: 2; Features: Automotive AEC-Q200; Length: 0.126inch; Height: 0.028inch; Width: 0.098inch; ComponentLink1URL: http://www.rohm.com/web/global/datasheet/KTR03EZPF/ktr-e; ComponentLink1Description: http://www.rohm.com/web/global/datasheet/KTR03EZPF/ktr-e; ComponentLink2URL: http://www.rohm.com/web/global/datasheet/ESR01MZPF/esr-e; ComponentLink2Description: http://www.rohm.com/web/global/datasheet/ESR01MZPF/esr-e; ComponentLink3URL: http://sigma.octopart.com/114726763/technical_drawing/TE-Connectivity-CRGP1206F4K7.pdf; ComponentLink3Description: http://sigma.octopart.com/114726763/technical_drawing/TE-Connectivity-CRGP1206F4K7.pdf; ComponentLink4URL: http://datasheet.octopart.com/CRGP1206F4K7-TE-Connectivity-datasheet-114718804.pdf; ComponentLink4Description: http://datasheet.octopart.com/CRGP1206F4K7-TE-Connectivity-datasheet-114718804.pdf; Stock 2: 3925; Pricing 2: 1=0.12, 10=0.11, 100=0.0424, 1000=0.01863 (USD); Mount: Surface Mount; Contact Plating: Matte,Tin; Military Standard: Not; Depth: 2.5mm; Radiation Hardening: No; Lead Free: Lead Free; Stock 3: 44690; Pricing 3: 1=0.22, 10=0.183, 100=0.0716, 1000=0.02996, 2500=0.02746 (USD); Stock 4: 44690; Pricing 4: 1=0.22, 10=0.183, 100=0.0716, 1000=0.02996, 2500=0.02746 (USD); .SCHCHK: USED; Supplier 1: Digi-Key; Supplier Part Number 1: RMCF1210JT4K70DKR-ND
footprint R-1210
pins: 1, 2

## R-4K99-0603
designator R?, comment 4K99  Case Code (Imperial): 0603
RES SMD 4.99K OHM 1% 1/8W 0603; Manufacturer: Vishay Beyschlag; Manufacturer Part Number: MCT06030C4991FP500; Resistance: 4.99kR; Temperature Coefficient: 50ppm/°C; Power Rating: 100mW; Voltage Rating: 75V; Max Power Dissipation: 125mW; .Creator: F:TALI; .PCBCHK: USED; Washability: OK; Supplier 1: Digi-Key; Stock 1: 60567; Pricing 1: 1=0.18, 10=0.152, 100=0.0596, 1000=0.02495, 2500=0.02287 (USD); Mount: Surface Mount; Case/Package: 0603; Weight: 7.1E-05oz; Contact Plating: Tin; Case Code (Metric): 1608; Min Operating Temperature: -55°C; Max Operating Temperature: 125°C; Tolerance: 1%; Composition: Thin Film; Package Quantity: 1; Packaging: Tape and Reel; Number of Terminations: 2; Termination: SMD/SMT; Military Standard: Not; Voltage Rating (DC): 75V; Length: 1.55mm; Height: 0.022inch; Width: 0.033inch; Depth: 0.85mm; Radiation Hardening: No; REACH SVHC: No SVHC; Lead Free: Lead Free; ComponentLink1URL: http://www.vishay.com/docs/28705/mcx0x0xpro.pdf; ComponentLink1Description: http://www.vishay.com/docs/28705/mcx0x0xpro.pdf; ComponentLink2URL: http://www.vishay.com/docs/28705/mc_pro.pdf; ComponentLink2Description: http://www.vishay.com/docs/28705/mc_pro.pdf; ComponentLink3URL: http://www.mouser.com/ds/2/427/mcx0x0xpro-223600.pdf; ComponentLink3Description: http://www.mouser.com/ds/2/427/mcx0x0xpro-223600.pdf; Supplier Part Number 1: MCT0603-4.99K-CFDKR-ND; .SCHCHK: USED
footprint R-0603
pins: 1, 2

## R-4R7-0603
designator R?, comment 4R7  Case Code (Imperial): 0603
RES SMD 4R7 5% 1/10W 0603; Manufacturer: Panasonic; Manufacturer Part Number: ERJ-3GEYJ4R7V; Resistance: 4.7R; Temperature Coefficient: 600ppm/°C; Max Power Dissipation: 100mW; Voltage Rating: 75V; Voltage Rating (DC): 50V; .PCBCHK: USED; .Creator: F:TALI; Washability: OK; Stock 1: 769647; Pricing 1: 1=0.1, 10=0.043, 100=0.0176, 1000=0.00791, 2500=0.00686 (USD); Mount: Surface Mount; Case/Package: 0603; Case Code (Metric): 1608; Contact Plating: Tin; Min Operating Temperature: -55°C; Max Operating Temperature: 155°C; Packaging: Tape and Reel; Tolerance: 5%; Composition: Thick Film; Military Standard: Not; Package Quantity: 1; Number of Terminations: 2; Power Rating: 100mW; Termination: SMD/SMT; Features: Automotive AEC-Q200; Length: 1.6mm; Height: 0.45mm; Depth: 0.8mm; Width: 0.031inch; Radiation Hardening: No; Lead Free: Lead Free; REACH SVHC: No SVHC; ComponentLink1URL: http://industrial.panasonic.com/www-data/pdf/AOA0000/AOA0000CE1.pdf; ComponentLink1Description: http://industrial.panasonic.com/www-data/pdf/AOA0000/AOA0000CE1.pdf; ComponentLink2URL: http://www.farnell.com/datasheets/1500035.pdf; ComponentLink2Description: http://www.farnell.com/datasheets/1500035.pdf; ComponentLink3URL: https://www.alliedelec.com/m/d/51cd0790071e1666bdb9d00c57fcf960.pdf; ComponentLink3Description: https://www.alliedelec.com/m/d/51cd0790071e1666bdb9d00c57fcf960.pdf; ComponentLink4URL: http://www.farnell.com/datasheets/1678796.pdf; ComponentLink4Description: http://www.farnell.com/datasheets/1678796.pdf; ComponentLink5URL: http://www.farnell.com/datasheets/2059623.pdf; ComponentLink5Description: http://www.farnell.com/datasheets/2059623.pdf; Stock 2: 149765; Pricing 2: 1=0.1, 10=0.033, 100=0.0136, 1000=0.00609, 2500=0.00529 (USD); ComponentLink6URL: http://www.produktinfo.conrad.com/datenblaetter/425000-449999/437315-da-01-en-SMD_WIDERSTAND_0603_RC_1608_4R70_1__0_1W.pdf; ComponentLink6Description: http://www.produktinfo.conrad.com/datenblaetter/425000-449999/437315-da-01-en-SMD_WIDERSTAND_0603_RC_1608_4R70_1__0_1W.pdf; ComponentLink7URL: http://www.produktinfo.conrad.com/datenblaetter/450000-474999/454725-da-01-en-WIDERSTAND_0603.pdf; ComponentLink7Description: http://www.produktinfo.conrad.com/datenblaetter/450000-474999/454725-da-01-en-WIDERSTAND_0603.pdf; Stock 3: 1700; Pricing 3: 100=0.0144, 1000=0.0064, 5000=0.00455, 15000=0.0039, 50000=0.00325 (USD); ComponentLink8URL: http://datasheet.octopart.com/0603SAJ047JT5E-Royal-Ohm-datasheet-17591904.pdf; ComponentLink8Description: http://datasheet.octopart.com/0603SAJ047JT5E-Royal-Ohm-datasheet-17591904.pdf; .SCHCHK: USED; Supplier 1: Digi-Key; Supplier Part Number 1: P4.7GCT-ND
footprint R-0603
pins: 1, 2

## R-4R7-0805
designator R?, comment 4R7  Case Code (Imperial): 0805
RES SMD 4.7 OHM 1% 1/8W 0805; Manufacturer: Samsung; Manufacturer Part Number: RC2012F4R7CS; Resistance: 4.7R; Temperature Coefficient: 300ppm/°C; Power Rating: 125mW; Voltage Rating (DC): 150V; .PCBCHK: USED; .Creator: F:TALI; Washability: OK; Stock 1: 39173; Pricing 1: 1=0.1, 10=0.059, 100=0.024, 1000=0.01079, 2500=0.00936 (USD); Case/Package: 0805; Case Code (Metric): 2012; Contact Plating: Tin; Min Operating Temperature: -55°C; Max Operating Temperature: 155°C; Tolerance: 1%; Composition: Thick Film; Packaging: Tape and Reel; Military Standard: Not; Max Power Dissipation: 125mW; Number of Terminations: 2; Features: Moisture Resistant; Length: 2mm; Height: 0.024inch; Depth: 1.25mm; Width: 0.049inch; Radiation Hardening: No; Lead Free: Lead Free; ComponentLink1URL: http://www.samsungsem.com/kr/support/product-search/chip-resistor/RC2012F4R7CS.jsp; ComponentLink1Description: http://www.samsungsem.com/kr/support/product-search/chip-resistor/RC2012F4R7CS.jsp; ComponentLink2URL: http://www.samsungsem.com/kr/support/library/product-catalog/__icsFiles/afieldfile/2015/09/22/CHIP_RESISTOR_2015.pdf; ComponentLink2Description: http://www.samsungsem.com/kr/support/library/product-catalog/__icsFiles/afieldfile/2015/09/22/CHIP_RESISTOR_2015.pdf; ComponentLink3URL: http://www.produktinfo.conrad.com/datenblaetter/450000-474999/457082-da-01-en-WIDERSTAND_0805.pdf; ComponentLink3Description: http://www.produktinfo.conrad.com/datenblaetter/450000-474999/457082-da-01-en-WIDERSTAND_0805.pdf; ComponentLink4URL: http://www.produktinfo.conrad.com/datenblaetter/425000-449999/443127-da-01-en-SMD_WIDERST__0805_RC_2012_4R70_1__0_125W.pdf; ComponentLink4Description: http://www.produktinfo.conrad.com/datenblaetter/425000-449999/443127-da-01-en-SMD_WIDERST__0805_RC_2012_4R70_1__0_125W.pdf; Stock 2: 440855; Pricing 2: 1=0.1, 10=0.061, 100=0.0249, 1000=0.0112, 2500=0.00972 (USD); Mount: Surface Mount; Package Quantity: 5000; Voltage Rating: 150V; Termination: SMD/SMT; REACH SVHC: No SVHC; ComponentLink5URL: http://www.farnell.com/datasheets/2371628.pdf; ComponentLink5Description: http://www.farnell.com/datasheets/2371628.pdf; ComponentLink6URL: http://www.mouser.com/ds/2/315/AOA0000CE1-37422.pdf; ComponentLink6Description: http://www.mouser.com/ds/2/315/AOA0000CE1-37422.pdf; ComponentLink7URL: http://www.farnell.com/datasheets/1500035.pdf; ComponentLink7Description: http://www.farnell.com/datasheets/1500035.pdf; ComponentLink8URL: http://components.arrow.com/part/dataview/3982364S5746817N1386; ComponentLink8Description: http://components.arrow.com/part/dataview/3982364S5746817N1386; ComponentLink9URL: http://industrial.panasonic.com/www-data/pdf/AOA0000/AOA0000CE1.pdf; ComponentLink9Description: http://industrial.panasonic.com/www-data/pdf/AOA0000/AOA0000CE1.pdf; ComponentLink10URL: https://www.alliedelec.com/m/d/51cd0790071e1666bdb9d00c57fcf960.pdf; ComponentLink10Description: https://www.alliedelec.com/m/d/51cd0790071e1666bdb9d00c57fcf960.pdf; ComponentLink11URL: http://www.farnell.com/datasheets/1678796.pdf; ComponentLink11Description: http://www.farnell.com/datasheets/1678796.pdf; ComponentLink12URL: http://www.onlinecomponents.com/productFiles/mf-PSC/aoa0000ce1.pdf; ComponentLink12Description: http://www.onlinecomponents.com/productFiles/mf-PSC/aoa0000ce1.pdf; Stock 3: 13415; Pricing 3: 1=0.19, 10=0.16, 100=0.0624, 1000=0.02614, 2500=0.02396 (USD); .SCHCHK: USED; Supplier 1: Digi-Key; Supplier Part Number 1: 1276-5171-1-ND
footprint R-0805
pins: 1, 2

## R-5K1-0603
designator R?, comment 5K1  Case Code (Imperial): 0603
RES SMD 5.1K OHM 5% 1/10W 0603; Manufacturer: Yageo; Manufacturer Part Number: RC0603JR-075K1L; Resistance: 5.1kR; Power Rating: 100mW; Voltage Rating: 50V; Temperature Coefficient: 100ppm/°C; .PCBCHK: USED; .Creator: F:TALI; Washability: OK; Stock 1: 78517; Pricing 1: 1=0.1, 10=0.022, 100=0.0088, 1000=0.00396, 2500=0.00344 (USD); Case/Package: 0603; Number of Pins: 2; Case Code (Metric): 1608; Min Operating Temperature: -55°C; Max Operating Temperature: 155°C; Tolerance: 5%; Packaging: Tape and Reel; Termination: SMD/SMT; Composition: Thick Film; Military Standard: Not; Voltage Rating (DC): 50V; Length: 1.6mm; Depth: 0.8mm; REACH SVHC: No SVHC; Lead Free: Lead Free; Stock 2: 859388; Pricing 2: 1=0.1, 10=0.065, 100=0.0264, 1000=0.01186, 2500=0.01029 (USD); Mount: Surface Mount; Weight: 7.1E-05oz; Contact Plating: Tin; Package Quantity: 1; Number of Terminations: 2; Max Power Dissipation: 100mW; Features: Automotive AEC-Q200; Height: 0.022inch; Width: 0.8mm; Radiation Hardening: No; ComponentLink1URL: http://industrial.panasonic.com/www-data/pdf/AOA0000/AOA0000CE2.pdf; ComponentLink1Description: http://industrial.panasonic.com/www-data/pdf/AOA0000/AOA0000CE2.pdf; ComponentLink2URL: http://industrial.panasonic.com/www-data/pdf/AOA0000/AOA0000CE3.pdf; ComponentLink2Description: http://industrial.panasonic.com/www-data/pdf/AOA0000/AOA0000CE3.pdf; ComponentLink3URL: http://www.farnell.com/datasheets/1911175.pdf; ComponentLink3Description: http://www.farnell.com/datasheets/1911175.pdf; ComponentLink4URL: http://www.farnell.com/datasheets/1678782.pdf; ComponentLink4Description: http://www.farnell.com/datasheets/1678782.pdf; ComponentLink5URL: https://www.alliedelec.com/m/d/623f45ff1957d936ff56d46fd1c28cac.pdf; ComponentLink5Description: https://www.alliedelec.com/m/d/623f45ff1957d936ff56d46fd1c28cac.pdf; Stock 3: 92096; Pricing 3: 1=0.1, 10=0.034, 100=0.0138, 1000=0.00618, 2500=0.00536 (USD); ComponentLink6URL: http://www.vishay.com/docs/20035/dcrcwe3.pdf; ComponentLink6Description: http://www.vishay.com/docs/20035/dcrcwe3.pdf; ComponentLink7URL: http://www.mouser.com/ds/2/427/dcrcwe3-109170.pdf; ComponentLink7Description: http://www.mouser.com/ds/2/427/dcrcwe3-109170.pdf; ComponentLink8URL: https://www.alliedelec.com/m/d/0c934d6939ccefa68dbe0b96d821c8cf.pdf; ComponentLink8Description: https://www.alliedelec.com/m/d/0c934d6939ccefa68dbe0b96d821c8cf.pdf; ComponentLink9URL: http://www.farnell.com/datasheets/1807946.pdf; ComponentLink9Description: http://www.farnell.com/datasheets/1807946.pdf; .SCHCHK: USED; Supplier 1: Digi-Key; Supplier Part Number 1: 311-5.1KGRDKR-ND
footprint R-0603
pins: 1, 2

## R-5K1-0805
designator R?, comment 5K1  Case Code (Imperial): 0805
RES SMD 5.1K OHM 5% 1/8W 0805; Manufacturer: Yageo; Manufacturer Part Number: RC0805JR-075K1L; Resistance: 5.1kR; Temperature Coefficient: 100ppm/°C; Power Rating: 125mW; Voltage Rating: 150V; .PCBCHK: USED; .Creator: F:TALI; Washability: OK; Stock 1: 824180; Pricing 1: 1=0.1, 10=0.039, 100=0.0159, 1000=0.00716, 2500=0.00622 (USD); Case/Package: 0805; Number of Pins: 2; Weight: 0.000194oz; Contact Plating: Lead,Matte,Tin; Case Code (Metric): 2012; Min Operating Temperature: -55°C; Max Operating Temperature: 155°C; Tolerance: 5%; Composition: Thick Film; Package Quantity: 1; Packaging: Tape and Reel; Number of Terminations: 2; Termination: SMD/SMT; Military Standard: Not; Max Power Dissipation: 125mW; Voltage Rating (DC): 150V; Features: Moisture Resistant; Length: 2mm; Height: 0.024inch; Width: 0.049inch; Depth: 1.25mm; Radiation Hardening: No; REACH SVHC: No SVHC; Lead Free: Lead Free; ComponentLink1URL: http://www.yageo.com.tw/exep/pages/download/literatures/PYu-R_INT-thick_7.pdf; ComponentLink1Description: http://www.yageo.com.tw/exep/pages/download/literatures/PYu-R_INT-thick_7.pdf; ComponentLink2URL: https://www.verical.com/server-webapp/html/getDatasheet?partID=329214; ComponentLink2Description: https://www.verical.com/server-webapp/html/getDatasheet?partID=329214; ComponentLink3URL: http://www.yageo.com/documents/recent/PYu-RC_Group_51_RoHS_L_9.pdf; ComponentLink3Description: http://www.yageo.com/documents/recent/PYu-RC_Group_51_RoHS_L_9.pdf; ComponentLink4URL: http://www.mouser.com/ds/2/447/Yageo_08112016_RC0805-968729.pdf; ComponentLink4Description: http://www.mouser.com/ds/2/447/Yageo_08112016_RC0805-968729.pdf; Stock 2: 15188; Pricing 2: 1=0.1, 10=0.076, 100=0.029, 1000=0.01278, 2500=0.01104 (USD); Mount: Surface Mount; Thickness: 508um; ComponentLink5URL: http://www.mouser.com/ds/2/54/chpreztr-977002.pdf; ComponentLink5Description: http://www.mouser.com/ds/2/54/chpreztr-977002.pdf; ComponentLink6URL: http://www.bourns.com/pdfs/chpreztr.pdf; ComponentLink6Description: http://www.bourns.com/pdfs/chpreztr.pdf; ComponentLink7URL: http://www.bourns.com/docs/Product-Datasheets/CHPREZTR.pdf; ComponentLink7Description: http://www.bourns.com/docs/Product-Datasheets/CHPREZTR.pdf; ComponentLink8URL: https://www.bourns.com/docs/Product-Datasheets/CHPREZTR.pdf; ComponentLink8Description: https://www.bourns.com/docs/Product-Datasheets/CHPREZTR.pdf; .SCHCHK: USED; Supplier 1: Digi-Key; Supplier Part Number 1: 311-5.1KARDKR-ND
footprint R-0805
pins: 1, 2

## R-5K6-0603
designator R?, comment 5K6  Tolerance: 1%  Case/Package: 0603
RES 5.6K OHM 1% 1/10W 0603; Manufacturer: Stackpole Electronics; Manufacturer Part Number: RMCF0603FT5K60; Resistance: 5.6kR; Temperature Coefficient: 100ppm/°C; Max Power Dissipation: 100mW; Washability: OK; .Creator: M.OZKAN; .PCBCHK: USED; Supplier 1: Digi-Key; Supplier Part Number 1: RMCF0603FT5K60CT-ND; Stock: 36544; Pricing: 1=0.1, 10=0.016, 100=0.0065, 1000=0.0029, 2500=0.0025 (USD); RoHS: Yes; Mount: Surface Mount; Contact Plating: Tin,Matte; Case Code (Imperial): 0603; Case Code (Metric): 1608; Min Operating Temperature: -55°C; Max Operating Temperature: 155°C; Packaging: Tape and Reel; Composition: Thick Film; Number of Terminations: 2; Features: Automotive AEC-Q200; Length: 0.061inch; Height: 0.022inch; Width: 0.031inch; Radiation Hardening: No; ComponentLink1URL: https://www.seielect.com/catalog/SEI-Packaging.pdf?src-supplier=Digi-Key; ComponentLink1Description: https://www.seielect.com/catalog/SEI-Packaging.pdf?src-supplier=Digi-Key; ComponentLink2URL: https://www.seielect.com/catalog/SEI-RMCF_RMCP.pdf?src-supplier=Avnet; ComponentLink2Description: https://www.seielect.com/catalog/SEI-RMCF_RMCP.pdf?src-supplier=Avnet; .SCHCHK: USED
footprint R-0603
pins: 1, 2

## R-5K6-0805
designator R?, comment 5K6  Case Code (Imperial): 0805